# Altium footprint library myPcb.PcbLib: 145 footprints (part 6 of 10)
Each footprint in its own frame and in the unit in brackets; x right, y up, seen from the top. Pads: shape width x height; smd on the part's side, far side on the other; paste and mask are expansions set on the pad; w line width, h text height; cw(c..) or ccw(c..) is an arc to the next point about the centre after c.
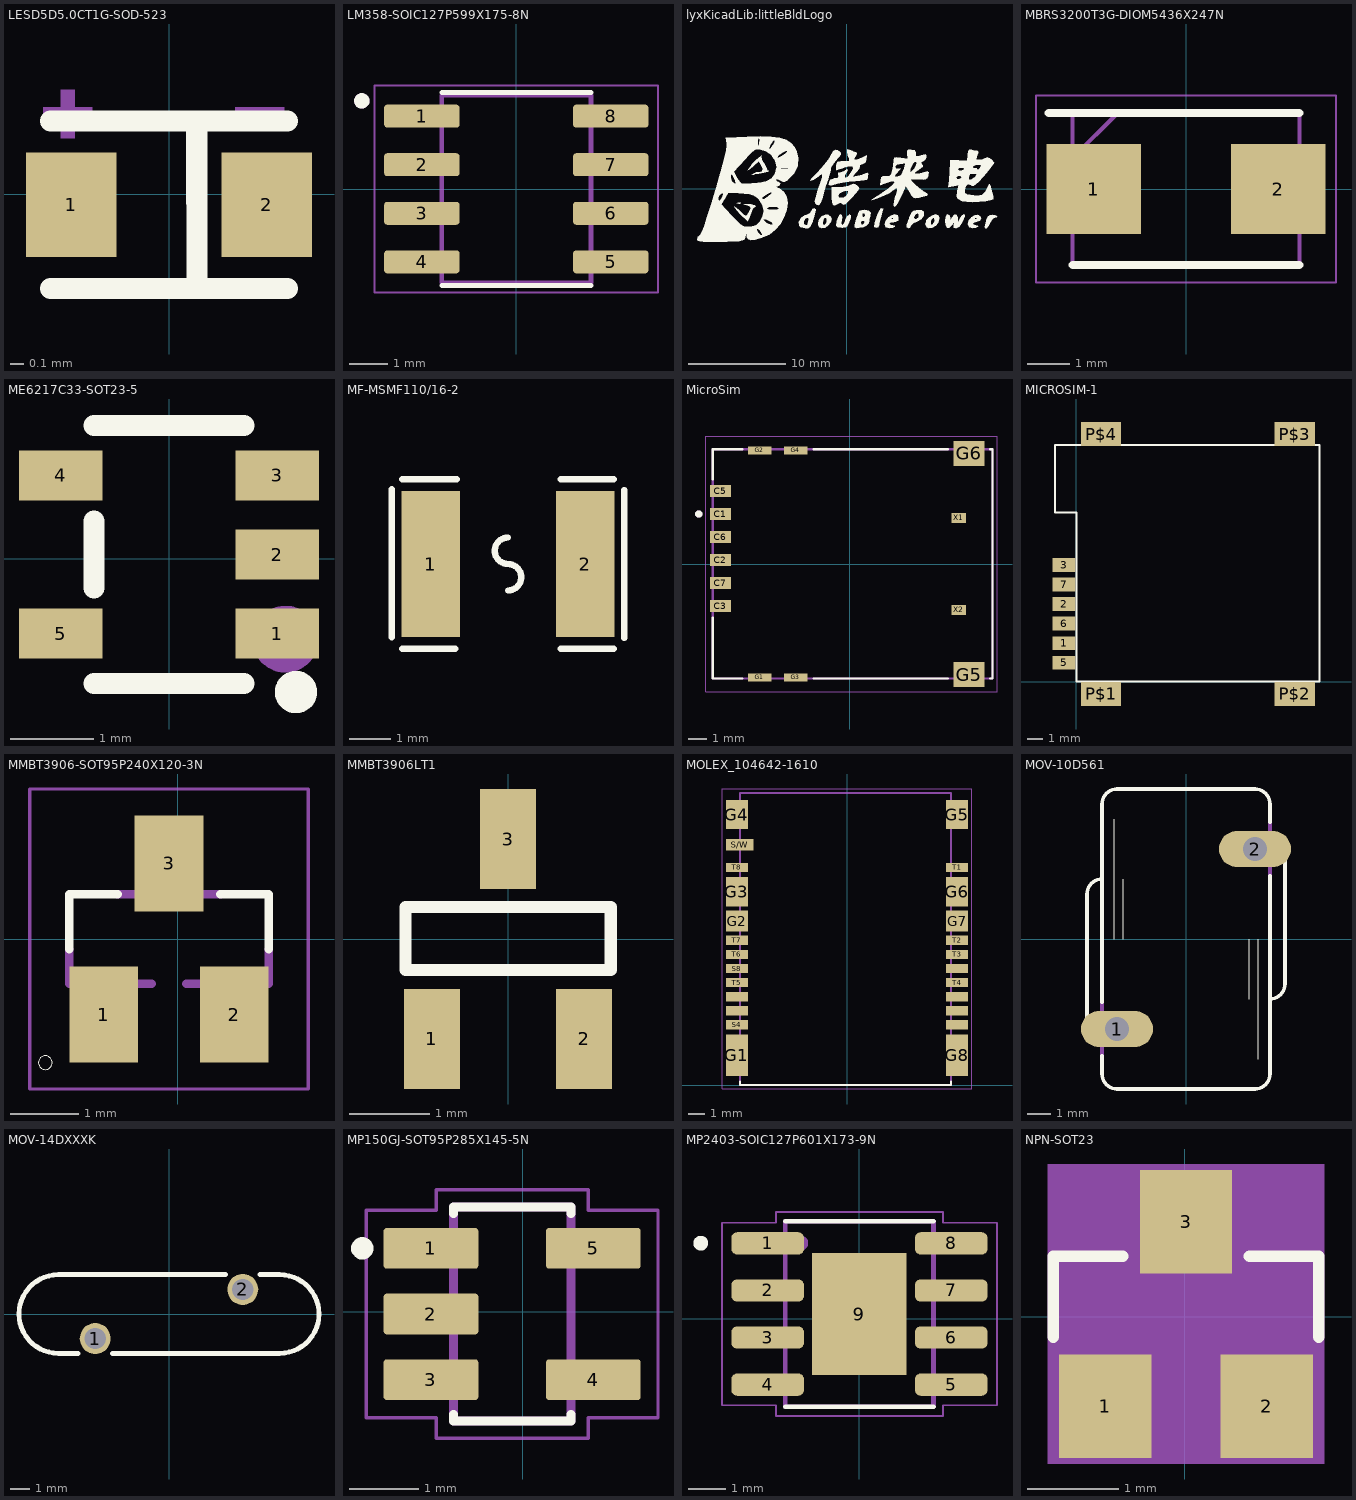
[diagram p5: the footprints below, top view; thin cyan lines are the x and y axes]

## LESD5D5.0CT1G-SOD-523 [mm] "TVS LESD5D5.0CT1G  乐山无线电"
pads (2):
  rect 0.65x0.75 smd paste+0 mask+0.051: 1(-0.7,-0.074) 2(0.7,-0.074)
Top Overlay:
  lines w0.152: -0.85,-0.674 0.85,-0.674 ; -0.85,0.526 0.85,0.526 ; 0.198,0.526 0.2,-0.674
Mechanical 15:
  region: -0.775,0.751 -0.775,0.401 -0.675,0.401 -0.675,0.751
  region: -0.9,0.526 -0.55,0.526 -0.55,0.626 -0.9,0.626
  region: 0.825,0.626 0.475,0.626 0.475,0.526 0.825,0.526

## LM358-SOIC127P599X175-8N [mm] "LM358"
height 1.75
pads (8):
  rrect25% 1.97x0.6 smd: 1(-2.47,1.905) 2(-2.47,0.635) 3(-2.47,-0.635) 4(-2.47,-1.905) 5(2.47,-1.905) 6(2.47,-0.635) 7(2.47,0.635) 8(2.47,1.905)
Top Overlay:
  circle w0.2: c-4.04,2.305 r0.1
  lines w0.127: -1.95,-2.525 1.95,-2.525 ; -1.95,2.525 1.95,2.525
Mechanical 13:
  circle w0.2: c-4.04,2.305 r0.1
  lines w0.127: -1.95,-2.452 1.95,-2.452 1.95,2.452 -1.95,2.452 -1.95,-2.452
Mechanical 15:
  lines w0.05: -3.705,-2.702 3.705,-2.702 3.705,2.702 -3.705,2.702 -3.705,-2.702
3D body "step_temp.STEP": height 1.75, standoff 0, extent -2.997,-2.451 2.997,2.451

## lyxKicadLib:littleBldLogo [mm]
Top Overlay:
  drawing of 20 lines, arcs and shapes, not listed

## MBRS3200T3G-DIOM5436X247N [mm] "MBRS3200T3G"
pads (2):
  rect 2.25x2.15 smd paste+0 mask+0.051: 1(-2.2,0) 2(2.2,0)
Top Overlay:
  lines w0.2: -3.275,1.812 2.702,1.812 ; -2.702,-1.812 2.702,-1.812
Mechanical 15:
  lines w0.05: -3.575,-2.225 3.575,-2.225 3.575,2.225 -3.575,2.225 -3.575,-2.225
  lines w0.1: -2.702,0.738 -1.628,1.812 ; -2.702,-1.812 2.702,-1.812 2.702,1.812 -2.702,1.812 -2.702,-1.812

## ME6217C33-SOT23-5 [mm] "SOT-23-5_L3.0-W1.7-P0.95-LS2.8-BR"
pads (5):
  rect 1x0.6 smd paste+0 mask+0.051: 1(1.3,-0.899) 2(1.3,0.05) 3(1.3,1) 4(-1.3,1.001) 5(-1.3,-0.899)
Top Overlay:
  circle w0.254: c1.524,-1.6 r0.127
  lines w0.254: -0.9,-1.5 0.9,-1.5 ; -0.9,-0.35 -0.9,0.45 ; -0.9,1.6 0.9,1.6
Mechanical 15:
  circle w0.4: c1.397,-0.965 r0.2

## MF-MSMF110/16-2 [mm]
pads (2):
  rect 1.407x3.499 smd paste-100 mask+0.051: 1(4.304,-5.27) 2(8.011,-5.27)
Top Overlay:
  lines w0.152: 3.364,-7.029 3.364,-3.473 ; 3.618,-7.302 4.888,-7.302 ; 3.618,-3.238 4.923,-3.238 ; 6.158,-5.905 ccw(c6.158,-5.588) 6.158,-5.27 cw(c6.158,-4.953) 6.158,-4.635 ; 7.428,-7.302 8.698,-7.302 ; 7.428,-3.238 8.698,-3.238 ; 8.952,-7.048 8.952,-3.492
Top Paste:
  region: 5.008,-6.92 5.008,-5.965 4.908,-5.865 4.629,-5.865 4.529,-5.765 4.529,-4.776 4.629,-4.676 4.908,-4.676 5.008,-4.576 5.008,-3.621 4.908,-3.521 3.701,-3.521 3.601,-3.621 3.601,-6.92 3.701,-7.02 4.908,-7.02
  region: 7.308,-6.92 7.308,-5.965 7.408,-5.865 7.686,-5.865 7.786,-5.765 7.786,-4.776 7.686,-4.676 7.408,-4.676 7.308,-4.576 7.308,-3.621 7.408,-3.521 8.614,-3.521 8.714,-3.621 8.714,-6.92 8.614,-7.02 7.408,-7.02

## MicroSim [mm] "molex micro sim"
pads (14):
  rect 1.15x0.65 smd: C1(-7.136,2.771) C2(-7.136,0.231) C3(-7.136,-2.309) C5(-7.136,4.041) C6(-7.136,1.501) C7(-7.136,-1.039)
  rect 1.3x0.45 smd: G1(-4.966,-6.254) G2(-4.966,6.286) G3(-2.966,-6.254) G4(-2.966,6.286)
  rect 1.7x1.4 smd: G5(6.594,-6.094) G6(6.594,6.116)
  rect 0.8x0.54 smd: X1(6.014,2.556) X2(6.014,-2.524)
Top Overlay:
  circle w0.2: c-8.331,2.771 r0.1
  lines w0.127: -7.566,-2.954 -7.566,-6.309 -5.936,-6.309 ; -7.566,4.686 -7.566,6.341 -5.936,6.341 ; -1.996,-6.309 5.424,-6.309 ; -1.996,6.341 5.424,6.341 ; 7.764,-6.309 7.884,-6.309 7.884,6.341 7.764,6.341
Mechanical 13:
  circle w0.2: c-8.331,2.771 r0.1
  lines w0.127: -7.566,-6.309 7.884,-6.309 7.884,6.341 -7.566,6.341 -7.566,-6.309
Mechanical 15:
  lines w0.05: -7.961,-7.044 -7.961,7.066 8.134,7.066 8.134,-7.044 -7.961,-7.044
3D body "step_temp.STEP": height 1.55, standoff 0, extent -7.601,-6.509 7.849,6.541

## MICROSIM-1 [mm]
pads (10):
  rect 1.5x0.9 smd paste+0 mask+0.051: 1(-0.8,2.5) 2(-0.8,5.04) 3(-0.8,7.58) 5(-0.8,1.23) 6(-0.8,3.77) 7(-0.8,6.31)
  rect 2.61x1.56 smd paste+0 mask+0.051: P$1(1.6,-0.8) P$2(14.2,-0.8) P$3(14.2,16.1) P$4(1.6,16.1)
Top Overlay:
  lines w0.127: -1.4,11 -1.4,15.4 15.8,15.4 15.8,0 0,0 0,11 -1.4,11

## MMBT3906-SOT95P240X120-3N [mm] "MMBT3906"
pads (3):
  rect 1x1.4 smd: 1(-1.077,-1.1) 2(0.823,-1.1) 3(-0.127,1.1)
Top Overlay:
  circle w0: c-1.927,-1.8 r0.1
  lines w0.127: -1.577,-0.15 -1.577,0.65 -0.877,0.65 ; 0.623,0.65 1.323,0.65 1.323,-0.15
Mechanical 13:
  region: 0.102,0.711 -0.356,0.711 -0.356,1.295 0.102,1.295
  region: 1.041,-1.298 0.586,-1.298 0.586,-0.711 1.041,-0.711
  region: -0.838,-1.296 -1.296,-1.296 -1.296,-0.711 -0.838,-0.711
  lines w0.127: -1.577,-0.15 -1.577,-0.65 -0.377,-0.65 ; -0.877,0.65 0.623,0.65 ; 0.123,-0.65 1.323,-0.65 1.323,-0.15
Mechanical 15:
  lines w0.051: -2.15,-2.183 1.896,-2.183 1.896,2.183 -2.15,2.183 -2.15,-2.183
3D body "step_temp.STEP": height 0.55, standoff -0.7, extent -1.59,-1.4 1.336,1.4

## MMBT3906LT1 [mm]
pads (3):
  rect 0.7x1.25 smd paste+0 mask+0.102: 1(-0.953,-1.25) 2(0.947,-1.25) 3(-0.003,1.25)
Top Overlay:
  lines w0.152: -1.283,-0.386 -1.283,0.401 1.283,0.401 1.283,-0.386 -1.283,-0.386

## MOLEX_104642-1610 [mm] "SIM+TF 2in1"
pads (25):
  rect 1.35x2.6 smd: G1(-6.875,1.85) G8(6.875,1.85)
  rect 1.35x1.34 smd: G2(-6.875,10.25) G7(6.875,10.25)
  rect 1.35x1.84 smd: G3(-6.875,12.09) G6(6.875,12.09)
  rect 1.35x1.8 smd: G4(-6.875,16.9) G5(6.875,16.9)
  rect 1.35x0.58 smd: S1_C1(6.875,3.76) S2_C2(6.875,4.64) S3_C3(-6.875,4.64) S4(-6.875,3.76) S5_C4(6.875,7.28) S6_C5(6.875,5.52) S7_C6(-6.875,5.52) S8(-6.875,7.28) T1(6.875,13.6) T2(6.875,9.04) T3(6.875,8.16) T4(6.875,6.4) T5(-6.875,6.4) T6(-6.875,8.16) T7(-6.875,9.04) T8(-6.875,13.6)
  rect 1.7x0.7 smd: S/W(-6.7,15.015)
Top Overlay:
  lines w0.127: -6.7,0.23 -6.7,0 6.5,0 6.5,0.23
Mechanical 13:
  lines w0.127: -6.7,0 6.5,0 6.5,18.25 -6.7,18.25 -6.7,0
Mechanical 15:
  lines w0.05: -7.8,-0.25 -7.8,18.5 7.8,18.5 7.8,-0.25 -7.8,-0.25

## MOV-10D561 [mil]
pads (2):
  oval 120x60 hole 40: 1(-115,-150) 2(115,150)
Top Overlay:
  lines w2: -120,0 -120,200 ; -105,0 -105,100 ; 105,-100 105,0 ; 120,-200 120,0
  lines w6: -165,-145 -165,75 cw(c-140,75) -140,100 ; -140,-195 -140,-225 ccw(c-115,-225) -115,-250 115,-250 ccw(c115,-225) 140,-225 140,105 ; -140,-105 -140,225 cw(c-115,225) -115,250 115,250 cw(c115,225) 140,225 140,195 ; 140,-100 ccw(c140,-75) 165,-75 165,145
Mechanical 13:
  lines w6: -165,-145 ccw(c-140,-145) -140,-170 ; -140,-195 -140,-105 ; 140,105 140,195 ; 140,170 cw(c140,145) 165,145

## MOV-14DXXXK [mm]
pads (2):
  round 1.6 hole 1.1 paste+0 mask+0.102: 1(-3.81,-1.27) 2(3.81,1.27)
Top Overlay:
  lines w0.254: -4.699,-2.032 -5.715,-2.032 cw(c-5.715,0) -5.715,2.032 2.921,2.032 ; -2.921,-2.032 5.715,-2.032 ccw(c5.715,0) 5.715,2.032 4.699,2.032

## MP150GJ-SOT95P285X145-5N [mm] "MP150"
pads (5):
  rrect15% 1.37x0.59 smd: 1(-1.33,0.92) 2(-1.33,-0.03) 3(-1.33,-0.98) 4(1.02,-0.98) 5(1.02,0.92)
Top Overlay:
  circle w0.2: c-2.324,0.92 r0.062
  lines w0.127: -1.005,-1.48 -1.005,-1.58 0.695,-1.58 0.695,-1.48 ; -1.005,1.42 -1.005,1.52 0.695,1.52 0.695,1.42
Mechanical 13:
  lines w0.127: -1.005,-1.58 -1.005,1.52 0.695,1.52 0.695,-1.58 -1.005,-1.58
Mechanical 15:
  lines w0.05: -2.265,-1.53 -1.255,-1.53 -1.255,-1.83 0.945,-1.83 0.945,-1.53 1.955,-1.53 1.955,1.47 0.945,1.47 0.945,1.77 -1.255,1.77 -1.255,1.47 -2.265,1.47 -2.265,-1.53

## MP2403-SOIC127P601X173-9N [mm] "MP2403"
pads (9):
  rrect52% 1.96x0.6 smd: 1(-2.475,2.032) 2(-2.475,0.762) 3(-2.475,-0.508) 4(-2.475,-1.778) 5(2.475,-1.778) 6(2.475,-0.508) 7(2.475,0.762) 8(2.475,2.032)
  rect 2.55x3.3 smd paste-3: 9(0,0.127)
Top Overlay:
  circle w0.2: c-4.28,2.037 r0.1
  lines w0.127: -2,-2.373 2,-2.373 ; -2,2.627 2,2.627
Top Paste:
  region: 0.806,-0.916 -0.806,-0.916 -0.806,1.17 0.806,1.17
Mechanical 13:
  circle w0.2: c-1.58,2.037 r0.1
  lines w0.127: -2,-2.373 -2,2.627 2,2.627 2,-2.373 -2,-2.373
Mechanical 15:
  lines w0.05: -3.71,-2.333 -3.71,2.587 -2.25,2.587 -2.25,2.877 2.25,2.877 2.25,2.587 3.71,2.587 3.71,-2.333 2.25,-2.333 2.25,-2.623 -2.25,-2.623 -2.25,-2.333 -3.71,-2.333

## NPN-SOT23 [mil] "NPN S8050"
pads (3):
  rect 40x45 smd: 1(-34.48,-38.79) 2(35.52,-38.79) 3(0.52,41.21)
Top Overlay:
  lines w5: -56.98,-8.79 -56.98,26.21 -26.98,26.21 ; 28.02,26.21 58.02,26.21 58.02,-8.79
Mechanical 13:
  region: 9.52,29.21 -8.48,29.21 -8.48,52.21 9.52,52.21
  region: 46.52,-49.8 28.53,-49.8 28.53,-26.79 46.52,-26.79
  region: -27.48,-49.79 -45.48,-49.79 -45.48,-26.79 -27.48,-26.79
Mechanical 15:
  region: 60.52,-63.86 -59.53,-63.86 -59.53,66.21 60.52,66.21
3D body "step_temp.STEP": height 55.12, standoff 0, extent -56.56,-49.97 57.61,52.39